# Altium footprint library SMD Component.PcbLib: 161 footprints (part 7 of 11)
Each footprint in its own frame and in the unit in brackets; x right, y up, seen from the top. Pads: shape width x height; smd on the part's side, far side on the other; paste and mask are expansions set on the pad; w line width, h text height; cw(c..) or ccw(c..) is an arc to the next point about the centre after c.
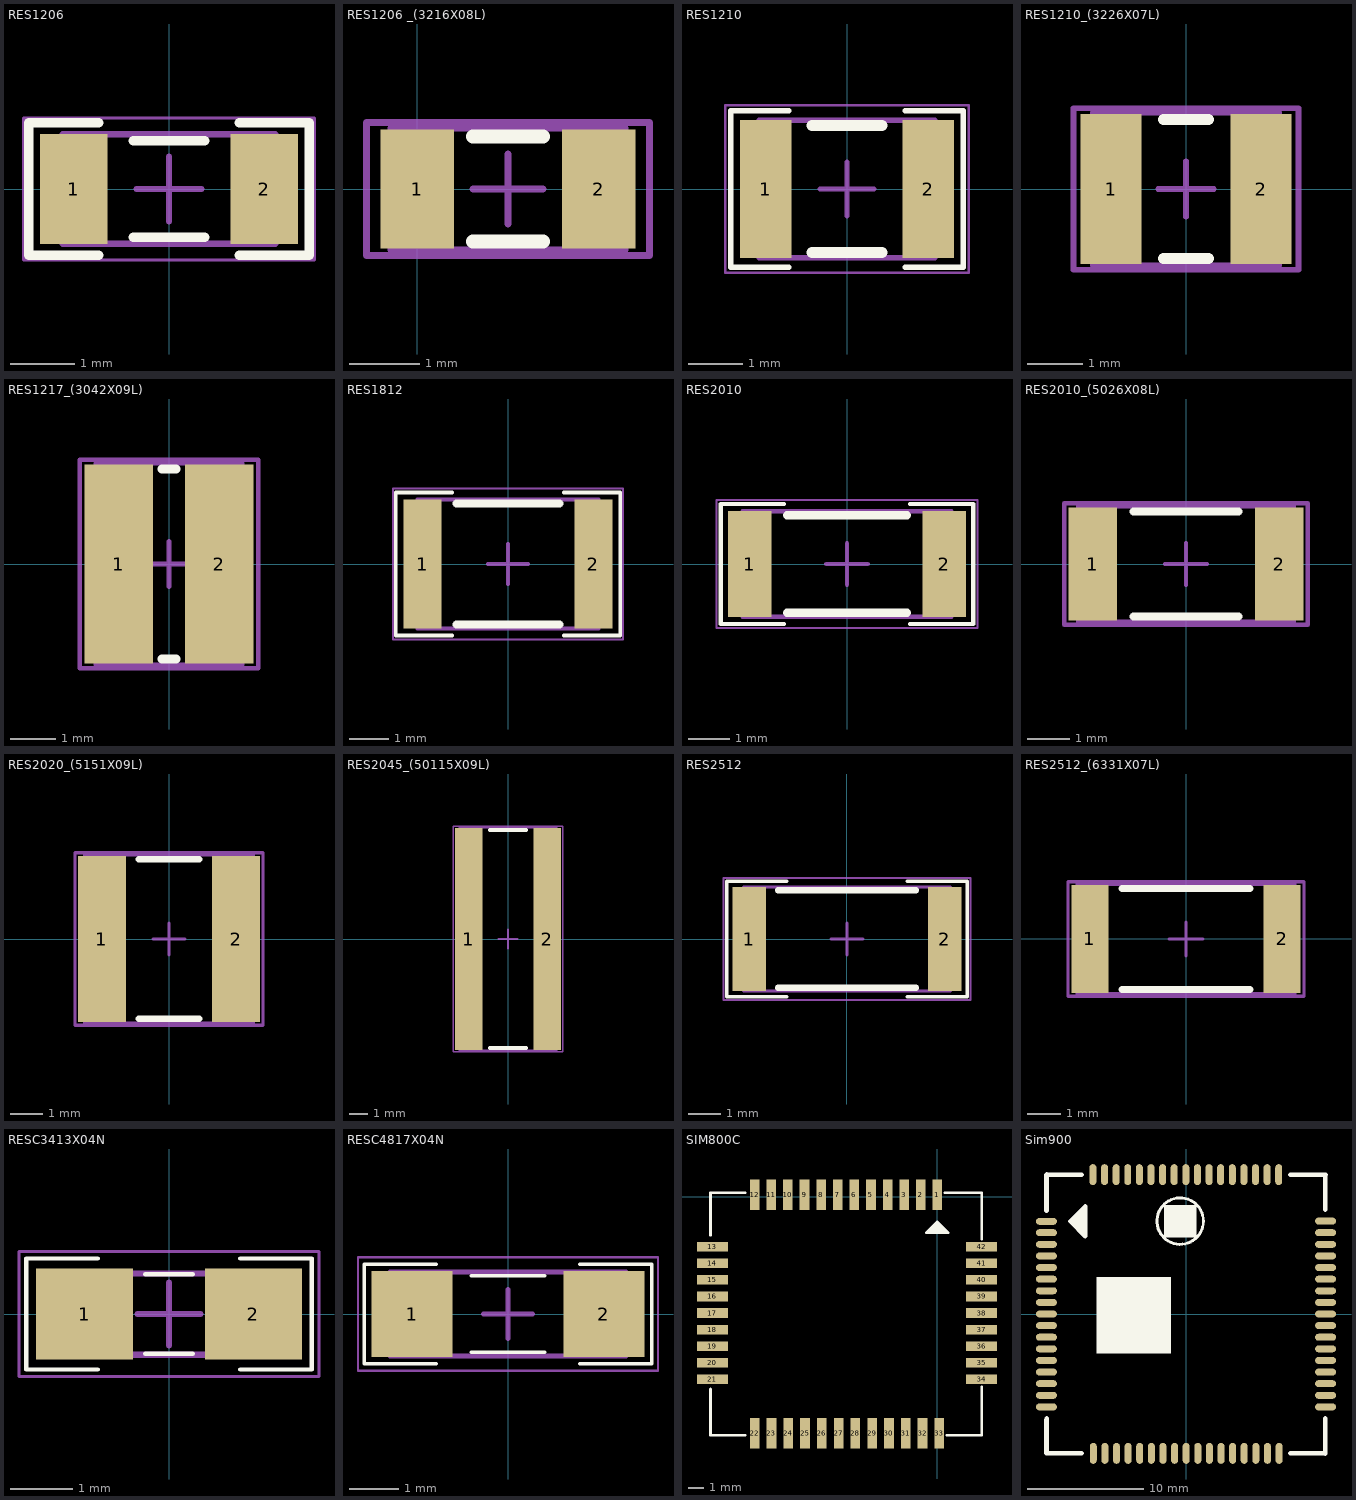
[diagram p6: the footprints below, top view; thin cyan lines are the x and y axes]

## RES1206 [mm] "Chip Resistor, 2-Leads, Body 3/20x1/60mm, IPC Medium Density DESIGNER:ABBAS BASEREH"
height 0.94
pads (2):
  rect 1.05x1.7 smd: 1(-1.475,0) 2(1.475,0)
Top Overlay:
  lines w0.15: -1.088,-1.025 -2.175,-1.025 -2.175,1.025 -1.088,1.025 ; -0.55,-0.75 0.55,-0.75 ; -0.55,0.75 0.55,0.75 ; 1.088,-1.025 2.175,-1.025 2.175,1.025 1.088,1.025
Mechanical 13:
  lines w0.1: -1.65,-0.85 -1.65,0.85 1.65,0.85 1.65,-0.85 -1.65,-0.85
Mechanical 15:
  lines w0.05: -2.25,-1.1 -2.25,1.1 2.25,1.1 2.25,-1.1 -2.25,-1.1
  lines w0.1: -0.5,0 0.5,0 ; 0,-0.5 0,0.5
3D body "RES1206.step": height 0.94, standoff 0, extent -1.65,-0.85 1.65,0.85

## RES1206 _(3216X08L) [mm] "Chip Resistor, 2-Leads, Body 3.2x1.6mm, IPC High Density _ (0.125 W)"
height 0.75
pads (2):
  rect 1.05x1.7 smd: 1(0,0) 2(2.596,0)
Top Overlay:
  lines w0.2: 0.798,-0.75 1.798,-0.75 ; 0.798,0.75 1.798,0.75
Mechanical 13:
  lines w0.1: -0.377,-0.875 -0.377,0.875 2.973,0.875 2.973,-0.875 -0.377,-0.875
Mechanical 15:
  lines w0.1: 0.798,0 1.798,0 ; 1.298,-0.5 1.298,0.5 ; -0.727,-0.95 -0.727,0.95 3.323,0.95 3.323,-0.95 -0.727,-0.95
3D body "1206.STEP": height 0.6, standoff 0, extent -0.226,-0.762 2.822,0.762

## RES1210 [mm] "Chip Resistor, 2-Leads, Body 3/20x2/50mm, IPC Medium Density DESIGNER:ABBAS BASEREH"
height 0.55
pads (2):
  rect 0.95x2.55 smd: 1(-1.5,0) 2(1.5,0)
Top Overlay:
  lines w0.1: -1.075,-1.45 -2.15,-1.45 -2.15,1.45 -1.075,1.45 ; 1.075,-1.45 2.15,-1.45 2.15,1.45 1.075,1.45
  lines w0.2: -0.65,-1.175 0.65,-1.175 ; -0.65,1.175 0.65,1.175
Mechanical 13:
  lines w0.1: -1.625,-1.275 -1.625,1.275 1.625,1.275 1.625,-1.275 -1.625,-1.275
Mechanical 15:
  lines w0.05: -2.25,-1.55 -2.25,1.55 2.25,1.55 2.25,-1.55 -2.25,-1.55
  lines w0.1: -0.5,0 0.5,0 ; 0,-0.5 0,0.5
3D body "RES1210.step": height 0.55, standoff 0, extent -1.625,-1.275 1.625,1.275

## RES1210_(3226X07L) [mm] "Chip Resistor, 2-Leads, Body 3.2x2.6mm, IPC High Density _ (0.250 W)"
height 0.7
pads (2):
  rect 1.1x2.7 smd: 1(-1.35,0) 2(1.35,0)
Top Overlay:
  lines w0.2: -0.4,-1.25 0.4,-1.25 ; -0.4,1.25 0.4,1.25
Mechanical 13:
  lines w0.1: -1.675,-1.375 1.675,-1.375 1.675,1.375 -1.675,1.375 -1.675,-1.375
Mechanical 15:
  lines w0.1: -0.5,0 0.5,0 ; 0,-0.5 0,0.5 ; -2.025,-1.45 2.025,-1.45 2.025,1.45 -2.025,1.45 -2.025,-1.45
3D body "1210.STEP": height 0.6, standoff 0, extent -1.524,-1.27 1.524,1.27

## RES1217_(3042X09L) [mm] "Chip Resistor, 2-Leads, Body 3.0x4.2mm, IPC High Density _ (0.250 W)"
height 0.9
pads (2):
  rect 1.5x4.35 smd: 1(-1.1,0) 2(1.1,0)
Top Overlay:
  lines w0.2: -0.15,-2.075 0.15,-2.075 ; -0.15,2.075 0.15,2.075
Mechanical 13:
  lines w0.1: -1.6,-2.2 1.6,-2.2 1.6,2.2 -1.6,2.2 -1.6,-2.2
Mechanical 15:
  lines w0.1: -0.5,0 0.5,0 ; 0,-0.5 0,0.5 ; -1.95,-2.275 1.95,-2.275 1.95,2.275 -1.95,2.275 -1.95,-2.275
3D body "1217.STEP": height 0.9, standoff 0, extent -1.524,-2.159 1.524,2.159

## RES1812 [mm] "Chip Resistor, 2-Leads, Body 4/50x3/20mm, IPC Medium Density DESIGNER:ABBAS BASEREH"
height 0.55
pads (2):
  rect 0.95x3.25 smd: 1(-2.15,0) 2(2.15,0)
Top Overlay:
  lines w0.1: -1.413,-1.8 -2.825,-1.8 -2.825,1.8 -1.413,1.8 ; 1.413,-1.8 2.825,-1.8 2.825,1.8 1.413,1.8
  lines w0.2: -1.3,-1.525 1.3,-1.525 ; -1.3,1.525 1.3,1.525
Mechanical 13:
  lines w0.1: -2.275,-1.625 2.275,-1.625 2.275,1.625 -2.275,1.625 -2.275,-1.625
Mechanical 15:
  lines w0.05: -2.9,-1.9 2.9,-1.9 2.9,1.9 -2.9,1.9 -2.9,-1.9
  lines w0.1: -0.5,0 0.5,0 ; 0,-0.5 0,0.5
3D body "RES1812.step": height 0.55, standoff 0, extent -2.275,-1.625 2.275,1.625

## RES2010 [mm] "Chip Resistor, 2-Leads, Body 5/00x2/50mm, IPC Medium Density DESIGNER:ABBAS BASEREH"
height 0.55
pads (2):
  rect 1.05x2.55 smd: 1(-2.35,0) 2(2.35,0)
Top Overlay:
  lines w0.1: -1.525,-1.45 -3.05,-1.45 -3.05,1.45 -1.525,1.45 ; 1.525,-1.45 3.05,-1.45 3.05,1.45 1.525,1.45
  lines w0.2: -1.45,-1.175 1.45,-1.175 ; -1.45,1.175 1.45,1.175
Mechanical 13:
  lines w0.1: -2.525,-1.275 2.525,-1.275 2.525,1.275 -2.525,1.275 -2.525,-1.275
Mechanical 15:
  lines w0.05: -3.15,-1.55 3.15,-1.55 3.15,1.55 -3.15,1.55 -3.15,-1.55
  lines w0.1: -0.5,0 0.5,0 ; 0,-0.5 0,0.5
3D body "RES2010.step": height 0.55, standoff 0, extent -2.525,-1.275 2.525,1.275

## RES2010_(5026X08L) [mm] "Chip Resistor, 2-Leads, Body 5.0x2.6mm, IPC High Density _ (0.250 W)"
height 0.8
pads (2):
  rect 1.15x2.7 smd: 1(-2.225,0) 2(2.225,0)
Top Overlay:
  lines w0.2: -1.25,-1.25 1.25,-1.25 ; -1.25,1.25 1.25,1.25
Mechanical 13:
  lines w0.1: -2.575,-1.375 -2.575,1.375 2.575,1.375 2.575,-1.375 -2.575,-1.375
Mechanical 15:
  lines w0.1: -0.5,0 0.5,0 ; 0,-0.5 0,0.5 ; -2.9,-1.45 -2.9,1.45 2.9,1.45 2.9,-1.45 -2.9,-1.45
3D body "2010.STEP": height 0.6, standoff 0, extent -2.54,-1.27 2.54,1.27

## RES2020_(5151X09L) [mm] "Chip Resistor, 2-Leads, Body 5.1x5.1mm, IPC High Density _ (0.5 W)"
height 0.9
pads (2):
  rect 1.5x5.2 smd: 1(-2.1,0) 2(2.1,0)
Top Overlay:
  lines w0.2: -0.95,-2.5 0.95,-2.5 ; -0.95,2.5 0.95,2.5
Mechanical 13:
  lines w0.1: -2.64,-2.64 2.64,-2.64 2.64,2.64 -2.64,2.64 -2.64,-2.64
Mechanical 15:
  lines w0.1: -0.5,0 0.5,0 ; 0,-0.5 0,0.5 ; -2.95,-2.7 2.95,-2.7 2.95,2.7 -2.95,2.7 -2.95,-2.7
3D body "2020.STEP": height 0.9, standoff 0, extent -2.54,-2.54 2.54,2.54

## RES2045_(50115X09L) [mm] "Chip Resistor, 2-Leads, Body 5.0x11.5mm, IPC High Density _ (1.0 W)"
height 0.9
pads (2):
  rect 1.45x11.75 smd: 1(-2.075,0) 2(2.075,0)
Top Overlay:
  lines w0.2: -0.95,-5.775 0.95,-5.775 ; -0.95,5.775 0.95,5.775
Mechanical 13:
  lines w0.1: -2.575,-5.9 -2.575,5.9 2.575,5.9 2.575,-5.9 -2.575,-5.9
Mechanical 15:
  lines w0.1: -0.5,0 0.5,0 ; 0,-0.5 0,0.5 ; -2.9,-5.975 -2.9,5.975 2.9,5.975 2.9,-5.975 -2.9,-5.975
3D body "2045.STEP": height 0.9, standoff 0, extent -2.54,-5.715 2.54,5.715

## RES2512 [mm] "Chip Resistor, 2-Leads, Body 6/40x3/20mm, IPC Medium Density DESIGNER:ABBAS BASEREH"
height 0.7
pads (2):
  rect 1.05x3.25 smd: 1(-3.05,0) 2(3.05,0)
Top Overlay:
  lines w0.1: -1.875,-1.8 -3.75,-1.8 -3.75,1.8 -1.875,1.8 ; 1.875,-1.8 3.75,-1.8 3.75,1.8 1.875,1.8
  lines w0.2: -2.15,-1.525 2.15,-1.525 ; -2.15,1.525 2.15,1.525
Mechanical 13:
  lines w0.1: -3.225,-1.625 3.225,-1.625 3.225,1.625 -3.225,1.625 -3.225,-1.625
Mechanical 15:
  lines w0.05: -3.85,-1.9 3.85,-1.9 3.85,1.9 -3.85,1.9 -3.85,-1.9
  lines w0.1: -0.5,0 0.5,0 ; 0,-0.5 0,0.5
3D body "RES2512.step": height 0.7, standoff 0, extent -3.225,-1.625 3.225,1.625

## RES2512_(6331X07L) [mm] "Chip Resistor, 2-Leads, Body 6.3x3.1mm, IPC High Density _ (0.500 W)"
height 0.7
pads (2):
  rect 1.1x3.2 smd: 1(-2.85,0) 2(2.85,0)
Top Overlay:
  lines w0.2: -1.9,-1.5 1.9,-1.5 ; -1.9,1.5 1.9,1.5
Mechanical 13:
  lines w0.1: -3.225,-1.625 3.225,-1.625 3.225,1.625 -3.225,1.625 -3.225,-1.625
Mechanical 15:
  lines w0.1: -0.5,0 0.5,0 ; 0,-0.5 0,0.5 ; -3.5,-1.7 3.5,-1.7 3.5,1.7 -3.5,1.7 -3.5,-1.7
3D body "2512.STEP": height 0.6, standoff 0, extent -3.175,-1.524 3.175,1.524

## RESC3413X04N [mm] "Chip Resistor, 2-Leads, Body 3/40x1/30mm, IPC Medium Density-Design:Abbas Basereh"
height 0.4
pads (2):
  rect 1.55x1.45 smd: 1(-1.35,0) 2(1.35,0)
Top Overlay:
  lines w0.07: -1.143,-0.889 -2.286,-0.889 -2.286,0.889 -1.143,0.889 ; -0.381,-0.635 0.381,-0.635 ; -0.381,0.635 0.381,0.635 ; 1.143,-0.889 2.286,-0.889 2.286,0.889 1.143,0.889
Mechanical 13:
  lines w0.1: -1.7,-0.65 1.7,-0.65 1.7,0.65 -1.7,0.65 -1.7,-0.65
Mechanical 15:
  lines w0.05: -2.4,-1 2.4,-1 2.4,1 -2.4,1 -2.4,-1
  lines w0.1: -0.5,0 0.5,0 ; 0,-0.5 0,0.5
3D body "User Library-0805(2012M) Res.STEP": height 0.79, standoff 0, extent -1.254,-0.622 1.254,0.622

## RESC4817X04N [mm] "Chip Resistor, 2-Leads, Body 4/80x1/70mm, IPC Medium Density-Design:Abbas Basereh"
height 0.4
pads (2):
  rect 1.65x1.75 smd: 1(-1.95,0) 2(1.95,0)
Top Overlay:
  lines w0.07: -1.46,-1.016 -2.921,-1.016 -2.921,1.016 -1.46,1.016 ; -0.75,-0.775 0.75,-0.775 ; -0.75,0.775 0.75,0.775 ; 1.46,-1.016 2.921,-1.016 2.921,1.016 1.46,1.016
Mechanical 13:
  lines w0.1: -2.4,-0.85 2.4,-0.85 2.4,0.85 -2.4,0.85 -2.4,-0.85
Mechanical 15:
  lines w0.05: -3.05,-1.15 3.05,-1.15 3.05,1.15 -3.05,1.15 -3.05,-1.15
  lines w0.1: -0.5,0 0.5,0 ; 0,-0.5 0,0.5
3D body "SW3dPS-1206 SMD Resistor.STEP": height 1, standoff 0, extent -1.6,-0.8 1.6,0.8

## SIM800C [mil]
pads (42):
  rect 25x80 smd: 1(0,5) 2(-43.18,5) 3(-86.36,5) 4(-129.55,5) 5(-172.73,5) 6(-215.91,5) 7(-259.09,5) 8(-302.27,5) 9(-345.45,5) 10(-388.64,5) 11(-431.82,5) 12(-475,5) 22(-475,-615) 23(-431.36,-615) 24(-387.73,-615) 25(-344.09,-615) 26(-300.45,-615) 27(-256.82,-615) 28(-213.18,-615) 29(-169.55,-615) 30(-125.91,-615) 31(-82.27,-615) 32(-38.64,-615) 33(5,-615)
  rect 80x25 smd: 13(-585,-130) 14(-585,-173.12) 15(-585,-216.25) 16(-585,-259.38) 17(-585,-302.5) 18(-585,-345.62) 19(-585,-388.75) 20(-585,-431.88) 21(-585,-475) 34(115,-475) 35(115,-431.88) 36(115,-388.75) 37(115,-345.62) 38(115,-302.5) 39(115,-259.38) 40(115,-216.25) 41(115,-173.12) 42(115,-130)
Top Overlay:
  lines w5: -27,-91 27,-91 ; -24,-88 24,-88 ; -21,-85 21,-85 ; -18,-82 18,-82 ; -15,-79 15,-79 ; -12,-76 12,-76 ; -9,-73 9,-73 ; -6,-70 6,-70 ; -3,-67 3,-67 ; -30,-94 29,-94 0,-64 -30,-94
  lines w7: -590,-500 -590,-620 -500,-620 ; -590,-100 -590,10 -500,10 ; 20,10 115,10 115,-110 ; 25,-620 115,-620 115,-495
3D body "SIM800C-1.STEP": height 87.85, standoff -4.27, extent -582.92,-613.11 110,5

## Sim900 [mm]
pads (68):
  oval 1.8x0.6 smd mask+0.102: 1(-12.016,7.981) 2(-12.016,7) 3(-12.016,6) 4(-12.016,5) 5(-12.016,4) 6(-12.016,3) 7(-12.016,2) 8(-12.016,1) 9(-12.016,0) 10(-12.016,-1) 11(-12.016,-2) 12(-12.016,-3) 13(-12.016,-4) 14(-12.016,-5) 15(-12.016,-6) 16(-12.016,-7) 17(-12.016,-8) 35(12.016,-8) 36(12.016,-7) 37(12.016,-6) 38(12.016,-5) 39(12.016,-4) 40(12.016,-3) 41(12.016,-2) 42(12.016,-1) 43(12.016,0) 44(12.016,1) 45(12.016,1.994) 46(12.016,3) 47(12.016,4) 48(12.016,5) 49(12.016,6) 50(12.016,7) 51(12.016,8)
  oval 0.6x1.8 smd mask+0.102: 18(-7.985,-12) 19(-6.984,-12) 20(-5.985,-12) 21(-4.985,-12) 22(-3.985,-12) 23(-2.984,-12) 24(-1.984,-12) 25(-0.985,-12) 26(0.015,-12) 27(1.015,-12) 28(2.016,-12) 29(3.015,-12) 30(4.015,-12) 31(5.01,-12) 32(6.015,-12) 33(7.016,-12) 34(8.016,-12) 52(7.984,12) 53(6.984,12) 54(5.984,12) 55(4.984,12) 56(3.984,12) 57(2.984,12) 58(1.984,12) 59(0.984,12) 60(-0.016,12) 61(-1.016,12) 62(-2.016,12) 63(-3.016,12) 64(-4.016,12) 65(-5.016,12) 66(-6.016,12) 67(-7.016,12) 68(-8.016,12)
Top Layer:
  lines w0.4: 12,-0.984 12.016,-1
Top Overlay:
  circle w0.254: c-0.5,8 r2
  rectangle: -7.7,-3.4 -1.3,3.2
  rectangle: -1.9,6.6 0.9,9.4
  lines w0.4: -12.016,-9.1 -12.016,-12 -9,-12 ; -12.016,8.9 -12.016,12 -9,12 -11.984,12 ; -12,-11.984 -12,-9 ; -12,9 -12,12.016 ; -9.433,7.474 -9.433,8.44 ; -9.046,7.099 -9.046,8.877 ; -8.671,7.982 -9.941,7.982 ; 9,-12 11.984,-12 11.984,-9.1 ; 11.966,12 9,12 12.016,12 ; 11.984,9.1 11.984,12 ; 12,-12.015 12,-9 ; 12,9 12,11.985 ; -9.941,7.982 -8.671,6.712 -8.671,9.252 -9.941,7.982 ; -7.285,-2.8 -1.685,-2.8 -1.685,2.8 -7.285,2.8 -7.285,-2.8
3D body "User Library-SIM900.STEP": height 3.02, standoff 0, extent -11.989,-12.005 12.011,11.995